# Altium footprint library Miscellaneous SMD.PcbLib: 82 footprints (part 3 of 7)
Each footprint in its own frame and in the unit in brackets; x right, y up, seen from the top. Pads: shape width x height; smd on the part's side, far side on the other; paste and mask are expansions set on the pad; w line width, h text height; cw(c..) or ccw(c..) is an arc to the next point about the centre after c.
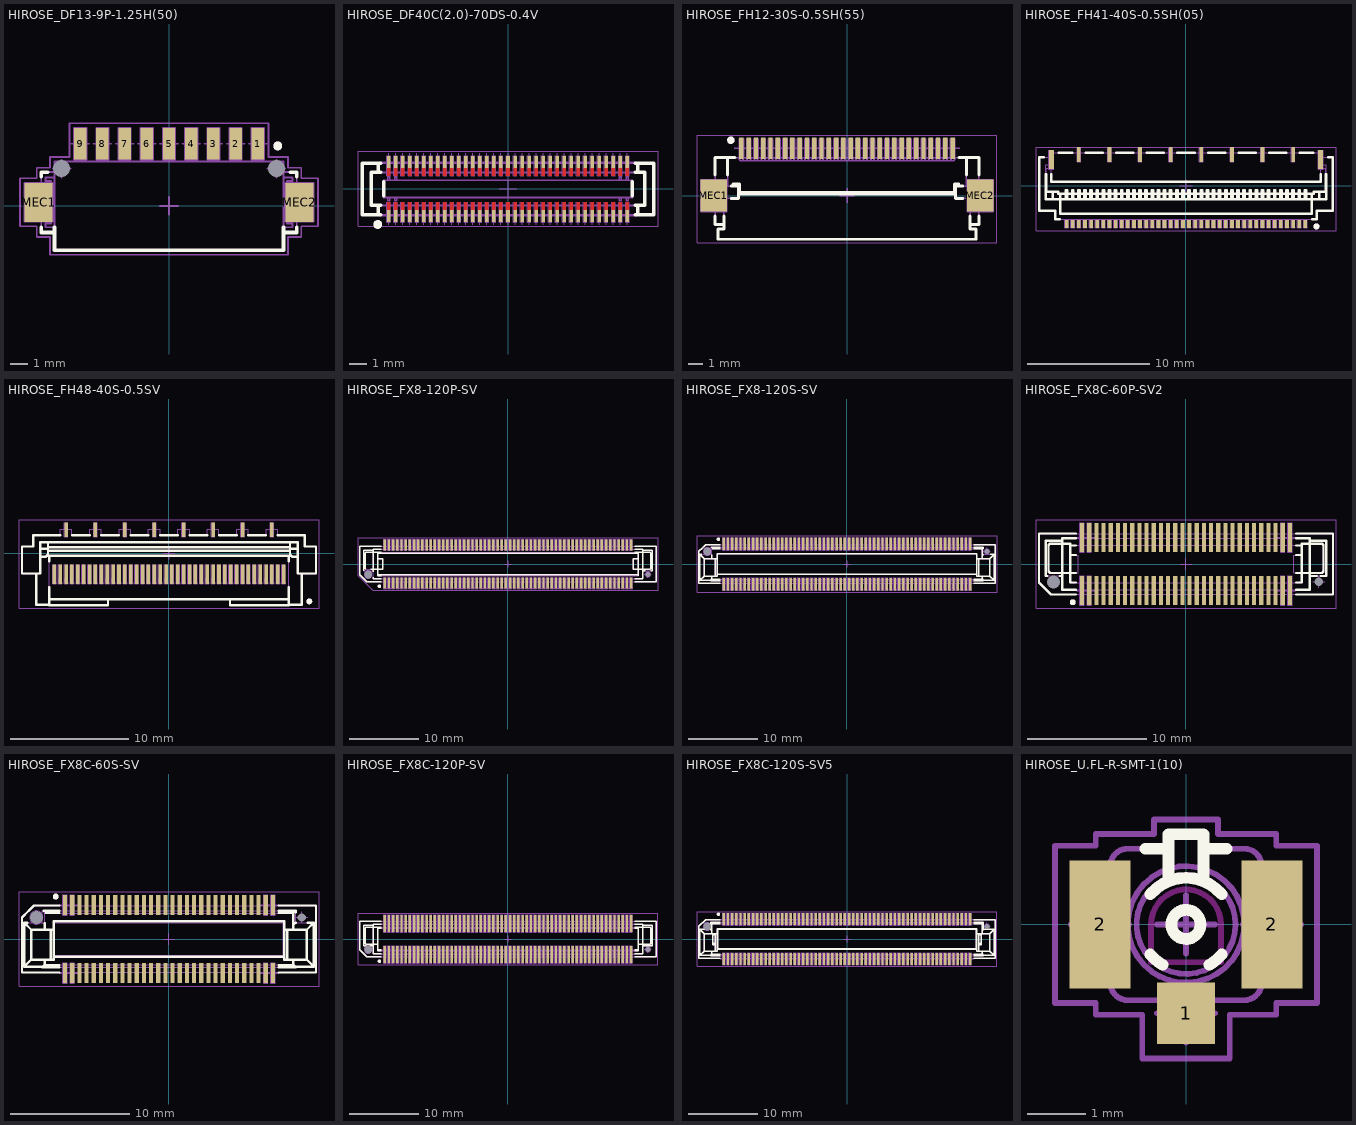
[diagram p2: the footprints below, top view; thin cyan lines are the x and y axes]

## HIROSE_DF13-9P-1.25H(50) [mm] "Pitch 1.25mm, Single Row, 9 Contacts, Right Angle SMT Header, Series DF13"
height 3.6
pads (13):
  rect 0.7x1.8 smd: 1(5,3.5) 2(3.75,3.5) 3(2.5,3.5) 4(1.25,3.5) 5(0,3.5) 6(-1.25,3.5) 7(-2.5,3.5) 8(-3.75,3.5) 9(-5,3.5)
  rect 1.6x2.2 smd: MEC1(-7.35,0.2) MEC2(7.35,0.2)
  round 0.5 hole 0.95 unplated mask+0.225: P1(-6.05,2.1) P2(6.05,2.1)
Top Overlay:
  circle w0.25: c6.125,3.376 r0.125
  lines w0.2: -7.2,-1.2 -7.2,-1.5 -6.45,-1.5 ; -7.2,1.65 -7.2,1.9 -6.825,1.9 ; -6.45,-1.2 -6.45,-2.5 6.45,-2.5 6.45,-1.2 ; 6.45,-1.5 7.2,-1.5 7.2,-1.2 ; 6.824,1.899 cw(c6.85,1.5) 6.85,1.9 ; 6.825,1.9 7.2,1.9 7.2,1.65
Mechanical 8:
  lines w0.1: -7.85,0.2 -7.35,0.2 ; -7.35,-0.3 -7.35,0.2 ; -7.35,0.7 -7.35,0.2 ; -6.85,0.2 -7.35,0.2 ; -6.55,2.1 -6.05,2.1 ; -6.05,1.6 -6.05,2.1 ; -6.05,2.6 -6.05,2.1 ; -5.55,2.1 -6.05,2.1 ; -5.5,3.5 -5,3.5 ; -5,3 -5,3.5 ; -5,4 -5,3.5 ; -4.5,3.5 -5,3.5 ; -4.25,3.5 -3.75,3.5 ; -3.75,3 -3.75,3.5 ; -3.75,4 -3.75,3.5 ; -3.25,3.5 -3.75,3.5 ; -3,3.5 -2.5,3.5 ; -2.5,3 -2.5,3.5 ; -2.5,4 -2.5,3.5 ; -2,3.5 -2.5,3.5 ; -1.75,3.5 -1.25,3.5 ; -1.25,3 -1.25,3.5 ; -1.25,4 -1.25,3.5 ; -0.75,3.5 -1.25,3.5 ; -0.5,0 0,0 ; -0.5,3.5 0,3.5 ; 0,-0.5 0,0 ; 0,0.5 0,0 ; 0,3 0,3.5 ; 0,4 0,3.5 ; 0.5,0 0,0 ; 0.5,3.5 0,3.5 ; 0.75,3.5 1.25,3.5 ; 1.25,3 1.25,3.5 ; 1.25,4 1.25,3.5 ; 1.75,3.5 1.25,3.5 ; 2,3.5 2.5,3.5 ; 2.5,3 2.5,3.5 ; 2.5,4 2.5,3.5 ; 3,3.5 2.5,3.5 ; 3.25,3.5 3.75,3.5 ; 3.75,3 3.75,3.5 ; 3.75,4 3.75,3.5 ; 4.25,3.5 3.75,3.5 ; 4.5,3.5 5,3.5 ; 5,3 5,3.5 ; 5,4 5,3.5 ; 5.5,3.5 5,3.5 ; 5.55,2.1 6.05,2.1 ; 6.05,1.6 6.05,2.1 ; 6.05,2.6 6.05,2.1 ; 6.55,2.1 6.05,2.1 ; 6.85,0.2 7.35,0.2 ; 7.35,-0.3 7.35,0.2 ; 7.35,0.7 7.35,0.2 ; 7.85,0.2 7.35,0.2 ; -8.15,-0.9 -6.55,-0.9 -6.55,1.3 -8.15,1.3 -8.15,-0.9 ; -5.35,2.6 -5.35,4.4 -4.65,4.4 -4.65,2.6 -5.35,2.6 ; -4.1,2.6 -4.1,4.4 -3.4,4.4 -3.4,2.6 -4.1,2.6 ; -2.85,2.6 -2.85,4.4 -2.15,4.4 -2.15,2.6 -2.85,2.6 ; -1.6,2.6 -1.6,4.4 -0.9,4.4 -0.9,2.6 -1.6,2.6 ; -0.35,2.6 -0.35,4.4 0.35,4.4 0.35,2.6 -0.35,2.6 ; 0.9,2.6 0.9,4.4 1.6,4.4 1.6,2.6 0.9,2.6 ; 2.15,2.6 2.15,4.4 2.85,4.4 2.85,2.6 2.15,2.6 ; 3.4,2.6 3.4,4.4 4.1,4.4 4.1,2.6 3.4,2.6 ; 4.65,2.6 4.65,4.4 5.35,4.4 5.35,2.6 4.65,2.6 ; 6.55,-0.9 8.15,-0.9 8.15,1.3 6.55,1.3 6.55,-0.9
Mechanical 14:
  circle w0.25: c6.125,3.376 r0.125
  lines w0.1: -7.2,-0.7 -7.2,-1.5 -6.45,-1.5 ; -7.2,1.1 -7.2,1.9 -6.45,1.9 ; -6.653,1.1 -7.95,1.1 -7.95,-0.7 -6.65,-0.7 ; -6.45,-1.2 -6.95,-1.2 -6.95,-1 -6.65,-1 -6.65,1.4 -6.95,1.4 -6.95,1.6 -6.45,1.6 ; -5.175,2.5 -5.175,3.725 ; -4.825,2.5 -4.825,3.725 ; -3.925,2.5 -3.925,3.725 ; -3.575,2.5 -3.575,3.725 ; -2.675,2.5 -2.675,3.725 ; -2.325,2.5 -2.325,3.725 ; -1.425,2.5 -1.425,3.725 ; -1.075,2.5 -1.075,3.725 ; -0.175,2.5 -0.175,3.725 ; 0.175,2.5 0.175,3.725 ; 1.075,2.5 1.075,3.725 ; 1.425,2.5 1.425,3.725 ; 2.325,2.5 2.325,3.725 ; 2.675,2.5 2.675,3.725 ; 3.575,2.5 3.575,3.725 ; 3.925,2.5 3.925,3.725 ; 4.825,2.5 4.825,3.725 ; 5.175,2.5 5.175,3.725 ; 6.45,-1.5 7.2,-1.5 7.2,-0.7 ; 6.45,-1.2 6.95,-1.2 6.95,-1 6.65,-1 6.65,1.4 6.95,1.4 6.95,1.6 6.45,1.6 ; 6.45,1.9 7.2,1.9 7.2,1.1 ; 6.65,-0.7 7.95,-0.7 7.95,1.1 6.653,1.1 ; -5.175,3.725 -5.075,4 -4.925,4 -4.825,3.725 ; -5.175,3.725 -4.825,3.725 ; -3.925,3.725 -3.825,4 -3.675,4 -3.575,3.725 ; -3.925,3.725 -3.575,3.725 ; -2.675,3.725 -2.575,4 -2.425,4 -2.325,3.725 ; -2.675,3.725 -2.325,3.725 ; -1.425,3.725 -1.325,4 -1.175,4 -1.075,3.725 ; -1.425,3.725 -1.075,3.725 ; -0.175,3.725 -0.075,4 0.075,4 0.175,3.725 ; -0.175,3.725 0.175,3.725 ; 1.075,3.725 1.175,4 1.325,4 1.425,3.725 ; 1.075,3.725 1.425,3.725 ; 2.325,3.725 2.425,4 2.575,4 2.675,3.725 ; 2.325,3.725 2.675,3.725 ; 3.575,3.725 3.675,4 3.825,4 3.925,3.725 ; 3.575,3.725 3.925,3.725 ; 4.825,3.725 4.925,4 5.075,4 5.175,3.725 ; 4.825,3.725 5.175,3.725 ; -6.45,-2.5 6.45,-2.5 6.45,2.5 -6.45,2.5 -6.45,-2.5
Mechanical 15:
  lines w0.1: -8.4,-1.15 -8.4,1.55 -7.45,1.55 -7.45,2.15 -6.7,2.15 -6.7,2.75 -5.6,2.75 -5.6,4.65 5.6,4.65 5.6,2.75 6.7,2.75 6.7,2.15 7.45,2.15 7.45,1.55 8.4,1.55 8.4,-1.15 7.45,-1.15 7.45,-1.75 6.7,-1.75 6.7,-2.75 -6.7,-2.75 -6.7,-1.75 -7.45,-1.75 -7.45,-1.15 -8.4,-1.15
3D body "HIROSE_DF13-9P-1.25H(50).stp": height 3.6, standoff -0.8, extent -7.95,-2.5 7.95,4

## HIROSE_DF40C(2.0)-70DS-0.4V [mm] "70 Contacts, 0.4mm Pitch, 2.0mm Height, Board-to-Board and Board-to-FPC Connector, DF40 Series"
height 2.1
pads (70):
  rect 0.2x0.7 smd: 1(-6.8,-1.54) 2(-6.8,1.54) 3(-6.4,-1.54) 4(-6.4,1.54) 5(-6,-1.54) 6(-6,1.54) 7(-5.6,-1.54) 8(-5.6,1.54) 9(-5.2,-1.54) 10(-5.2,1.54) 11(-4.8,-1.54) 12(-4.8,1.54) 13(-4.4,-1.54) 14(-4.4,1.54) 15(-4,-1.54) 16(-4,1.54) 17(-3.6,-1.54) 18(-3.6,1.54) 19(-3.2,-1.54) 20(-3.2,1.54) 21(-2.8,-1.54) 22(-2.8,1.54) 23(-2.4,-1.54) 24(-2.4,1.54) 25(-2,-1.54) 26(-2,1.54) 27(-1.6,-1.54) 28(-1.6,1.54) 29(-1.2,-1.54) 30(-1.2,1.54) 31(-0.8,-1.54) 32(-0.8,1.54) 33(-0.4,-1.54) 34(-0.4,1.54) 35(0,-1.54) 36(0,1.54) 37(0.4,-1.54) 38(0.4,1.54) 39(0.8,-1.54) 40(0.8,1.54) 41(1.2,-1.54) 42(1.2,1.54) 43(1.6,-1.54) 44(1.6,1.54) 45(2,-1.54) 46(2,1.54) 47(2.4,-1.54) 48(2.4,1.54) 49(2.8,-1.54) 50(2.8,1.54) 51(3.2,-1.54) 52(3.2,1.54) 53(3.6,-1.54) 54(3.6,1.54) 55(4,-1.54) 56(4,1.54) 57(4.4,-1.54) 58(4.4,1.54) 59(4.8,-1.54) 60(4.8,1.54) 61(5.2,-1.54) 62(5.2,1.54) 63(5.6,-1.54) 64(5.6,1.54) 65(6,-1.54) 66(6,1.54) 67(6.4,-1.54) 68(6.4,1.54) 69(6.8,-1.54) 70(6.8,1.54)
Top Layer:
  region: 0.5,1.2 0.3,1.2 0.3,0.75 0.5,0.75
  rectangle: -6.9,-1.2 -6.7,-0.75
  rectangle: -6.5,-1.2 -6.3,-0.75
  rectangle: -6.1,-1.2 -5.9,-0.75
  rectangle: -5.7,-1.2 -5.5,-0.75
  rectangle: -5.3,-1.2 -5.1,-0.75
  rectangle: -4.9,-1.2 -4.7,-0.75
  rectangle: -4.5,-1.2 -4.3,-0.75
  rectangle: -4.1,-1.2 -3.9,-0.75
  rectangle: -3.7,-1.2 -3.5,-0.75
  rectangle: -3.3,-1.2 -3.1,-0.75
  rectangle: -2.9,-1.2 -2.7,-0.75
  rectangle: -2.5,-1.2 -2.3,-0.75
  rectangle: -2.1,-1.2 -1.9,-0.75
  rectangle: -1.7,-1.2 -1.5,-0.75
  rectangle: -1.3,-1.2 -1.1,-0.75
  rectangle: -0.9,-1.2 -0.7,-0.75
  rectangle: -0.5,-1.2 -0.3,-0.75
  rectangle: -0.1,-1.2 0.1,-0.75
  rectangle: 0.3,-1.2 0.5,-0.75
  rectangle: 0.7,-1.2 0.9,-0.75
  rectangle: 1.1,-1.2 1.3,-0.75
  rectangle: 1.5,-1.2 1.7,-0.75
  rectangle: 1.9,-1.2 2.1,-0.75
  rectangle: 2.3,-1.2 2.5,-0.75
  rectangle: 2.7,-1.2 2.9,-0.75
  rectangle: 3.1,-1.2 3.3,-0.75
  rectangle: 3.5,-1.2 3.7,-0.75
  rectangle: 3.9,-1.2 4.1,-0.75
  rectangle: 4.3,-1.2 4.5,-0.75
  rectangle: 4.7,-1.2 4.9,-0.75
  rectangle: 5.1,-1.2 5.3,-0.75
  rectangle: 5.5,-1.2 5.7,-0.75
  rectangle: 5.9,-1.2 6.1,-0.75
  rectangle: 6.3,-1.2 6.5,-0.75
  rectangle: 6.7,-1.2 6.9,-0.75
  region: -6.7,1.2 -6.9,1.2 -6.9,0.75 -6.7,0.75
  region: -6.7,1.2 -6.9,1.2 -6.9,0.75 -6.7,0.75
  region: -6.3,1.2 -6.5,1.2 -6.5,0.75 -6.3,0.75
  region: -5.9,1.2 -6.1,1.2 -6.1,0.75 -5.9,0.75
  region: -5.5,1.2 -5.7,1.2 -5.7,0.75 -5.5,0.75
  region: -5.1,1.2 -5.3,1.2 -5.3,0.75 -5.1,0.75
  region: -4.7,1.2 -4.9,1.2 -4.9,0.75 -4.7,0.75
  region: -4.3,1.2 -4.5,1.2 -4.5,0.75 -4.3,0.75
  region: -3.9,1.2 -4.1,1.2 -4.1,0.75 -3.9,0.75
  region: -3.5,1.2 -3.7,1.2 -3.7,0.75 -3.5,0.75
  region: -3.1,1.2 -3.3,1.2 -3.3,0.75 -3.1,0.75
  region: -2.7,1.2 -2.9,1.2 -2.9,0.75 -2.7,0.75
  region: -2.3,1.2 -2.5,1.2 -2.5,0.75 -2.3,0.75
  region: -1.9,1.2 -2.1,1.2 -2.1,0.75 -1.9,0.75
  region: -1.5,1.2 -1.7,1.2 -1.7,0.75 -1.5,0.75
  region: -1.1,1.2 -1.3,1.2 -1.3,0.75 -1.1,0.75
  region: -0.7,1.2 -0.9,1.2 -0.9,0.75 -0.7,0.75
  region: -0.3,1.2 -0.5,1.2 -0.5,0.75 -0.3,0.75
  region: 0.1,1.2 -0.1,1.2 -0.1,0.75 0.1,0.75
  region: 0.9,1.2 0.7,1.2 0.7,0.75 0.9,0.75
  region: 1.3,1.2 1.1,1.2 1.1,0.75 1.3,0.75
  region: 1.7,1.2 1.5,1.2 1.5,0.75 1.7,0.75
  region: 2.1,1.2 1.9,1.2 1.9,0.75 2.1,0.75
  region: 2.5,1.2 2.3,1.2 2.3,0.75 2.5,0.75
  region: 2.9,1.2 2.7,1.2 2.7,0.75 2.9,0.75
  region: 3.3,1.2 3.1,1.2 3.1,0.75 3.3,0.75
  region: 3.7,1.2 3.5,1.2 3.5,0.75 3.7,0.75
  region: 4.1,1.2 3.9,1.2 3.9,0.75 4.1,0.75
  region: 4.5,1.2 4.3,1.2 4.3,0.75 4.5,0.75
  region: 4.9,1.2 4.7,1.2 4.7,0.75 4.9,0.75
  region: 5.3,1.2 5.1,1.2 5.1,0.75 5.3,0.75
  region: 5.7,1.2 5.5,1.2 5.5,0.75 5.7,0.75
  region: 6.1,1.2 5.9,1.2 5.9,0.75 6.1,0.75
  region: 6.5,1.2 6.3,1.2 6.3,0.75 6.5,0.75
  region: 6.9,1.2 6.7,1.2 6.7,0.75 6.9,0.75
Top Overlay:
  circle w0.25: c-7.425,-2.024 r0.125
  lines w0.2: -7.4,-1.47 -7.4,-0.94 ; -7.4,0.94 -7.4,1.47 ; -7.25,-1.47 -8.3,-1.47 -8.3,1.47 -7.25,1.47 ; -7.25,-0.94 -7.8,-0.94 -7.8,0.94 -7.25,0.94 ; -7.09,-0.4 -7.09,0.4 ; 7.09,-0.4 7.09,0.4 ; 7.25,-1.47 8.3,-1.47 8.3,1.47 7.25,1.47 ; 7.25,-0.94 7.8,-0.94 7.8,0.94 7.25,0.94 ; 7.4,-1.47 7.4,-0.94 ; 7.4,0.94 7.4,1.47
Mechanical 8:
  drawing of 706 lines, arcs and shapes, not listed
Mechanical 14:
  circle w0.25: c-7.425,-2.024 r0.125
  lines w0.1: -7.4,-1.47 -7.4,-0.94 ; -7.4,0.94 -7.4,1.47 ; -6.86,-1.47 -6.86,-1.69 -6.74,-1.69 -6.74,-1.47 ; -6.86,-0.495 -6.86,-0.675 -6.74,-0.675 -6.74,-0.495 ; -6.86,0.495 -6.86,0.675 -6.74,0.675 -6.74,0.495 ; -6.86,1.47 -6.86,1.69 -6.74,1.69 -6.74,1.47 ; -6.46,-1.47 -6.46,-1.69 -6.34,-1.69 -6.34,-1.47 ; -6.46,-0.495 -6.46,-0.675 -6.34,-0.675 -6.34,-0.495 ; -6.46,0.495 -6.46,0.675 -6.34,0.675 -6.34,0.495 ; -6.46,1.47 -6.46,1.69 -6.34,1.69 -6.34,1.47 ; 6.34,-1.47 6.34,-1.69 6.46,-1.69 6.46,-1.47 ; 6.34,-0.495 6.34,-0.675 6.46,-0.675 6.46,-0.495 ; 6.34,0.495 6.34,0.675 6.46,0.675 6.46,0.495 ; 6.34,1.47 6.34,1.69 6.46,1.69 6.46,1.47 ; 6.74,-1.47 6.74,-1.69 6.86,-1.69 6.86,-1.47 ; 6.74,-0.495 6.74,-0.675 6.86,-0.675 6.86,-0.495 ; 6.74,0.495 6.74,0.675 6.86,0.675 6.86,0.495 ; 6.74,1.47 6.74,1.69 6.86,1.69 6.86,1.47 ; 7.4,-1.47 7.4,-0.94 ; 7.4,0.94 7.4,1.47 ; -8.3,-1.47 -8.3,1.47 8.3,1.47 8.3,-1.47 -8.3,-1.47 ; -7.8,-0.94 -7.8,0.94 7.8,0.94 7.8,-0.94 -7.8,-0.94 ; -7.09,-0.495 7.09,-0.495 7.09,0.495 -7.09,0.495 -7.09,-0.495
Mechanical 15:
  lines w0.05: -8.55,-2.14 8.55,-2.14 8.55,2.14 -8.55,2.14 -8.55,-2.14
3D body "HIROSE_DF14C(2.0)-70DS-0.4V.stp": height 1.95, standoff 0, extent -8.3,-1.69 8.3,1.69

## HIROSE_FH12-30S-0.5SH(55) [mm] "30 Contacts, Pitch 0.5mm, Bottom Contact Type, Right Angled Surface Mount Connector for FPC/FCC, FH12 Serie"
height 2
pads (32):
  rect 0.3x1.5 smd: 1(-7.25,3.25) 2(-6.75,3.25) 3(-6.25,3.25) 4(-5.75,3.25) 5(-5.25,3.25) 6(-4.75,3.25) 7(-4.25,3.25) 8(-3.75,3.25) 9(-3.25,3.25) 10(-2.75,3.25) 11(-2.25,3.25) 12(-1.75,3.25) 13(-1.25,3.25) 14(-0.75,3.25) 15(-0.25,3.25) 16(0.25,3.25) 17(0.75,3.25) 18(1.25,3.25) 19(1.75,3.25) 20(2.25,3.25) 21(2.75,3.25) 22(3.25,3.25) 23(3.75,3.25) 24(4.25,3.25) 25(4.75,3.25) 26(5.25,3.25) 27(5.75,3.25) 28(6.25,3.25) 29(6.75,3.25) 30(7.25,3.25)
  rect 1.8x2.2 smd: MEC1(-9.15,0) MEC2(9.15,0)
Top Overlay:
  circle w0.25: c-7.975,3.8 r0.125
  lines w0.2: -9.05,-1.4 -9.05,-2 -8.45,-2 ; -9.05,1.4 -9.05,2.6 -7.7,2.6 ; -8.45,-1.4 -8.45,-2.3 -8.85,-2.3 -8.85,-3 8.85,-3 8.85,-2.3 8.45,-2.3 8.45,-1.4 ; -8.2,1.4 -8.2,2.6 ; -7.95,-0.2 -7.45,-0.2 -7.45,0.649 -7.95,0.649 ; -7.828,0.65 -7.828,0.8 -7.375,0.8 -7.375,0.2 7.375,0.2 7.375,0.8 7.673,0.8 7.673,0.65 ; -7.45,0.1 7.45,0.1 ; 7.7,2.6 9.05,2.6 9.05,1.4 ; 7.95,-0.2 7.45,-0.2 7.45,0.65 7.95,0.65 ; 8.2,1.4 8.2,2.6 ; 8.45,-2 9.05,-2 9.05,-1.4
Mechanical 8:
  drawing of 231 lines, arcs and shapes, not listed
Mechanical 14:
  drawing of 218 lines, arcs and shapes, not listed
Mechanical 15:
  lines w0.05: -10.3,-3.25 -10.3,4.15 10.3,4.15 10.3,-3.25 -10.3,-3.25
3D body "HIROSE_FH12-30S-0.5SH(55).stp": height 2.05, standoff 0, extent -9.55,-3 9.55,3.4

## HIROSE_FH41-40S-0.5SH(05) [mm] "40 Contacts, 0.5mm Pitch, 2.5mm, Horizontal Mounting, High Speed Transmission Connector for Shielded FFC, FH41 Serie"
height 2.5
pads (50):
  rect 0.3x0.65 smd: 1(9.75,-3.1) 2(9.25,-3.1) 3(8.75,-3.1) 4(8.25,-3.1) 5(7.75,-3.1) 6(7.25,-3.1) 7(6.75,-3.1) 8(6.25,-3.1) 9(5.75,-3.1) 10(5.25,-3.1) 11(4.75,-3.1) 12(4.25,-3.1) 13(3.75,-3.1) 14(3.25,-3.1) 15(2.75,-3.1) 16(2.25,-3.1) 17(1.75,-3.1) 18(1.25,-3.1) 19(0.75,-3.1) 20(0.25,-3.1) 21(-0.25,-3.1) 22(-0.75,-3.1) 23(-1.25,-3.1) 24(-1.75,-3.1) 25(-2.25,-3.1) 26(-2.75,-3.1) 27(-3.25,-3.1) 28(-3.75,-3.1) 29(-4.25,-3.1) 30(-4.75,-3.1) 31(-5.25,-3.1) 32(-5.75,-3.1) 33(-6.25,-3.1) 34(-6.75,-3.1) 35(-7.25,-3.1) 36(-7.75,-3.1) 37(-8.25,-3.1) 38(-8.75,-3.1) 39(-9.25,-3.1) 40(-9.75,-3.1)
  rect 0.4x1.55 smd: 41(11,2.15) 42(-11,2.15)
  rect 0.3x1.2 smd: G1(8.75,2.575) G2(6.25,2.575) G3(3.75,2.575) G4(1.25,2.575) G5(-1.25,2.575) G6(-3.75,2.575) G7(-6.25,2.575) G8(-8.75,2.575)
Top Overlay:
  drawing of 200 lines, arcs and shapes, not listed
Mechanical 8:
  drawing of 304 lines, arcs and shapes, not listed
Mechanical 14:
  drawing of 343 lines, arcs and shapes, not listed
Mechanical 15:
  lines w0.05: -12.25,-3.675 12.25,-3.675 12.25,3.175 -12.25,3.175 -12.25,-3.675
3D body "HIROSE_FH41-40S-0.5SH(05).stp": height 2.5, standoff 0, extent -12,-3.225 12,3.025

## HIROSE_FH48-40S-0.5SV [mm] "40 Contacts, 0.5mm Pitch, 2.5mm,Vertical Entry, High Speed Transmission Connector for Shielded FFC"
height 2.5
pads (48):
  rect 0.3x1.63 smd: 1(9.75,-1.785) 2(9.25,-1.785) 3(8.75,-1.785) 4(8.25,-1.785) 5(7.75,-1.785) 6(7.25,-1.785) 7(6.75,-1.785) 8(6.25,-1.785) 9(5.75,-1.785) 10(5.25,-1.785) 11(4.75,-1.785) 12(4.25,-1.785) 13(3.75,-1.785) 14(3.25,-1.785) 15(2.75,-1.785) 16(2.25,-1.785) 17(1.75,-1.785) 18(1.25,-1.785) 19(0.75,-1.785) 20(0.25,-1.785) 21(-0.25,-1.785) 22(-0.75,-1.785) 23(-1.25,-1.785) 24(-1.75,-1.785) 25(-2.25,-1.785) 26(-2.75,-1.785) 27(-3.25,-1.785) 28(-3.75,-1.785) 29(-4.25,-1.785) 30(-4.75,-1.785) 31(-5.25,-1.785) 32(-5.75,-1.785) 33(-6.25,-1.785) 34(-6.75,-1.785) 35(-7.25,-1.785) 36(-7.75,-1.785) 37(-8.25,-1.785) 38(-8.75,-1.785) 39(-9.25,-1.785) 40(-9.75,-1.785)
  rect 0.3x1.2 smd: G1(8.75,2) G2(6.25,2) G3(3.75,2) G4(1.25,2) G5(-1.25,2) G6(-3.75,2) G7(-6.25,2) G8(-8.75,2)
Top Overlay:
  circle w0.25: c11.927,-4.086 r0.125
  lines w0.2: -11.275,-1.72 -11.275,-4.37 -10.185,-4.37 ; -10.935,-0.3 -10.485,-0.3 -10.285,-0.1 -10.285,0.95 ; -10.935,0.384 -10.285,0.384 ; -10.385,-0.2 10.398,-0.2 ; -10.285,0.22 10.285,0.22 ; -10.285,0.52 10.285,0.52 ; -10.185,-3.92 -5.185,-3.92 ; -10.185,-2.9 -10.185,-4.37 ; -10.185,-0.67 -10.185,-0.2 ; -9.25,1.53 -11.535,1.53 -11.535,0.58 -12.5,0.58 -12.5,-1.72 -10.935,-1.72 -10.935,0.95 10.935,0.95 10.935,-1.72 12.5,-1.72 12.5,0.58 11.535,0.58 11.535,1.53 9.25,1.53 ; -8.25,1.53 -6.75,1.53 ; -5.75,1.53 -4.25,1.53 ; -3.25,1.53 -1.75,1.53 ; -0.75,1.53 0.75,1.53 ; 1.75,1.53 3.25,1.53 ; 4.25,1.53 5.75,1.53 ; 6.75,1.53 8.25,1.53 ; 10.185,-3.92 5.185,-3.92 ; 10.185,-2.9 10.185,-4.37 ; 10.185,-0.67 10.185,-0.2 ; 10.285,0.384 10.935,0.384 ; 10.285,0.95 10.285,-0.1 10.485,-0.3 10.935,-0.3 ; 11.275,-1.72 11.275,-4.37 10.185,-4.37 ; -10.185,-4.37 -10.185,-4.42 -5.185,-4.42 -5.185,-3.92 ; -5.185,-3.92 5.185,-3.92 ; 5.185,-3.92 5.185,-4.42 10.185,-4.42 10.185,-4.37
Mechanical 8:
  drawing of 292 lines, arcs and shapes, not listed
Mechanical 14:
  circle w0.25: c11.927,-4.086 r0.125
  lines w0.1: -11.275,-1.72 -11.275,-4.37 -10.185,-4.37 ; -10.935,-0.3 -10.485,-0.3 -10.285,-0.1 -10.285,0.95 ; -10.935,0.384 -10.285,0.384 ; -10.385,-0.2 10.398,-0.2 ; -10.285,0.22 10.285,0.22 ; -10.285,0.52 10.285,0.52 ; -10.185,-3.92 -5.185,-3.92 ; -10.185,-0.2 -10.185,-4.37 ; -8.81,2.05 -8.81,2.35 -8.69,2.35 -8.69,2.05 ; -6.31,2.05 -6.31,2.35 -6.19,2.35 -6.19,2.05 ; -3.81,2.05 -3.81,2.35 -3.69,2.35 -3.69,2.05 ; -1.31,2.05 -1.31,2.35 -1.19,2.35 -1.19,2.05 ; 1.19,2.05 1.19,2.35 1.31,2.35 1.31,2.05 ; 3.69,2.05 3.69,2.35 3.81,2.35 3.81,2.05 ; 6.19,2.05 6.19,2.35 6.31,2.35 6.31,2.05 ; 8.69,2.05 8.69,2.35 8.81,2.35 8.81,2.05 ; 10.185,-3.92 5.185,-3.92 ; 10.185,-0.2 10.185,-4.37 ; 10.285,0.384 10.935,0.384 ; 10.285,0.95 10.285,-0.1 10.485,-0.3 10.935,-0.3 ; 11.275,-1.72 11.275,-4.37 10.185,-4.37 ; -10.185,-4.37 -10.185,-4.42 -5.185,-4.42 -5.185,-3.92 ; -5.185,-3.92 5.185,-3.92 ; 5.185,-3.92 5.185,-4.42 10.185,-4.42 10.185,-4.37 ; -12.5,-1.72 -10.935,-1.72 -10.935,0.95 10.935,0.95 10.935,-1.72 12.5,-1.72 12.5,0.58 11.535,0.58 11.535,1.53 9.25,1.53 9.25,2.05 8.25,2.05 8.25,1.53 6.75,1.53 6.75,2.05 5.75,2.05 5.75,1.53 4.25,1.53 4.25,2.05 3.25,2.05 3.25,1.53 1.75,1.53 1.75,2.05 0.75,2.05 0.75,1.53 -0.75,1.53 -0.75,2.05 -1.75,2.05 -1.75,1.53 -3.25,1.53 -3.25,2.05 -4.25,2.05 -4.25,1.53 -5.75,1.53 -5.75,2.05 -6.75,2.05 -6.75,1.53 -8.25,1.53 -8.25,2.05 -9.25,2.05 -9.25,1.53 -11.535,1.53 -11.535,0.58 -12.5,0.58 -12.5,-1.72
Mechanical 15:
  lines w0.05: -12.75,-4.67 -12.75,2.85 12.75,2.85 12.75,-4.67 -12.75,-4.67
3D body "HIROSE_FH48-40S-0.5SV.stp": height 6.18, standoff 0, extent -12.5,-4.42 12.5,2.35

## HIROSE_FX8-120P-SV [mm] "120 Contacts, Pitch 0.6mm, Surface Mount Board to Board Header, FX8 Series"
height 3.1
pads (122):
  rect 0.35x1.6 smd: 1(-17.7,-2.75) 2(-17.7,2.75) 3(-17.1,-2.75) 4(-17.1,2.75) 5(-16.5,-2.75) 6(-16.5,2.75) 7(-15.9,-2.75) 8(-15.9,2.75) 9(-15.3,-2.75) 10(-15.3,2.75) 11(-14.7,-2.75) 12(-14.7,2.75) 13(-14.1,-2.75) 14(-14.1,2.75) 15(-13.5,-2.75) 16(-13.5,2.75) 17(-12.9,-2.75) 18(-12.9,2.75) 19(-12.3,-2.75) 20(-12.3,2.75) 21(-11.7,-2.75) 22(-11.7,2.75) 23(-11.1,-2.75) 24(-11.1,2.75) 25(-10.5,-2.75) 26(-10.5,2.75) 27(-9.9,-2.75) 28(-9.9,2.75) 29(-9.3,-2.75) 30(-9.3,2.75) 31(-8.7,-2.75) 32(-8.7,2.75) 33(-8.1,-2.75) 34(-8.1,2.75) 35(-7.5,-2.75) 36(-7.5,2.75) 37(-6.9,-2.75) 38(-6.9,2.75) 39(-6.3,-2.75) 40(-6.3,2.75) 41(-5.7,-2.75) 42(-5.7,2.75) 43(-5.1,-2.75) 44(-5.1,2.75) 45(-4.5,-2.75) 46(-4.5,2.75) 47(-3.9,-2.75) 48(-3.9,2.75) 49(-3.3,-2.75) 50(-3.3,2.75) 51(-2.7,-2.75) 52(-2.7,2.75) 53(-2.1,-2.75) 54(-2.1,2.75) 55(-1.5,-2.75) 56(-1.5,2.75) 57(-0.9,-2.75) 58(-0.9,2.75) 59(-0.3,-2.75) 60(-0.3,2.75) 61(0.3,-2.75) 62(0.3,2.75) 63(0.9,-2.75) 64(0.9,2.75) 65(1.5,-2.75) 66(1.5,2.75) 67(2.1,-2.75) 68(2.1,2.75) 69(2.7,-2.75) 70(2.7,2.75) 71(3.3,-2.75) 72(3.3,2.75) 73(3.9,-2.75) 74(3.9,2.75) 75(4.5,-2.75) 76(4.5,2.75) 77(5.1,-2.75) 78(5.1,2.75) 79(5.7,-2.75) 80(5.7,2.75) 81(6.3,-2.75) 82(6.3,2.75) 83(6.9,-2.75) 84(6.9,2.75) 85(7.5,-2.75) 86(7.5,2.75) 87(8.1,-2.75) 88(8.1,2.75) 89(8.7,-2.75) 90(8.7,2.75) 91(9.3,-2.75) 92(9.3,2.75) 93(9.9,-2.75) 94(9.9,2.75) 95(10.5,-2.75) 96(10.5,2.75) 97(11.1,-2.75) 98(11.1,2.75) 99(11.7,-2.75) 100(11.7,2.75) 101(12.3,-2.75) 102(12.3,2.75) 103(12.9,-2.75) 104(12.9,2.75) 105(13.5,-2.75) 106(13.5,2.75) 107(14.1,-2.75) 108(14.1,2.75) 109(14.7,-2.75) 110(14.7,2.75) 111(15.3,-2.75) 112(15.3,2.75) 113(15.9,-2.75) 114(15.9,2.75) 115(16.5,-2.75) 116(16.5,2.75) 117(17.1,-2.75) 118(17.1,2.75) 119(17.7,-2.75) 120(17.7,2.75)
  round 0.5 hole 1.1 unplated mask+0.3: P1(-20.1,-1.5)
  round 0.5 hole 0.7 unplated mask+0.1: P1(20.1,-1.5)
Top Overlay:
  circle w0.25: c-18.475,-3.2 r0.125
  lines w0.2: -20.75,-0.952 -20.75,1.95 -19.35,1.95 ; -20.429,-0.716 cw(c-20.326,-0.576) -20.5,-0.576 -20.5,1.526 cw(c-20.326,1.526) -20.326,1.7 -18.175,1.7 ; -19.7,-0.75 -18,-0.75 -18,0.75 -18.699,0.75 ; -19.35,-1.9 -19.35,-2.15 -18.175,-2.15 ; -19.35,-1.1 -19.35,-0.75 ; -19.35,1.7 -19.35,2.15 -18.175,2.15 ; -19.339,-0.75 -19.339,1.7 ; -18.7,-1.55 18.7,-1.55 ; -18.699,1.55 18.699,1.55 ; -18.699,1.7 -18.7,-1.7 -18.175,-1.7 ; -18.175,-2.55 -20.3,-2.55 -21.3,-1.55 -21.3,2.55 -18.175,2.55 ; 18.175,-2.55 21.3,-2.55 21.3,2.55 18.175,2.55 ; 18.175,-2.15 19.35,-2.15 19.35,-0.75 ; 18.175,1.7 20.326,1.7 cw(c20.326,1.526) 20.5,1.526 20.5,-0.576 cw(c20.326,-0.576) 20.326,-0.75 18,-0.75 18,0.75 18.699,0.75 ; 18.175,2.15 19.35,2.15 19.35,1.7 ; 18.7,-1.7 18.7,1.7 ; 19.339,-0.75 19.339,1.7 ; 19.35,-1 19.685,-1 ; 19.35,1.95 20.75,1.95 20.75,-1 20.515,-1
Mechanical 8:
  drawing of 734 lines, arcs and shapes, not listed
Mechanical 14:
  drawing of 398 lines, arcs and shapes, not listed
Mechanical 15:
  lines w0.05: -21.55,-1.654 -19.404,-3.8 21.55,-3.8 21.55,3.8 -21.55,3.8 -21.55,-1.654
3D body "HIROSE_FX8-120P-SV.stp": height 2.8, standoff -0.85, extent -21.3,-3.25 21.3,3.25
